# Altium footprint library LukaLIBRARY.PcbLib: 772 footprints (part 26 of 49)
Each footprint in its own frame and in the unit in brackets; x right, y up, seen from the top. Pads: shape width x height; smd on the part's side, far side on the other; paste and mask are expansions set on the pad; w line width, h text height; cw(c..) or ccw(c..) is an arc to the next point about the centre after c.
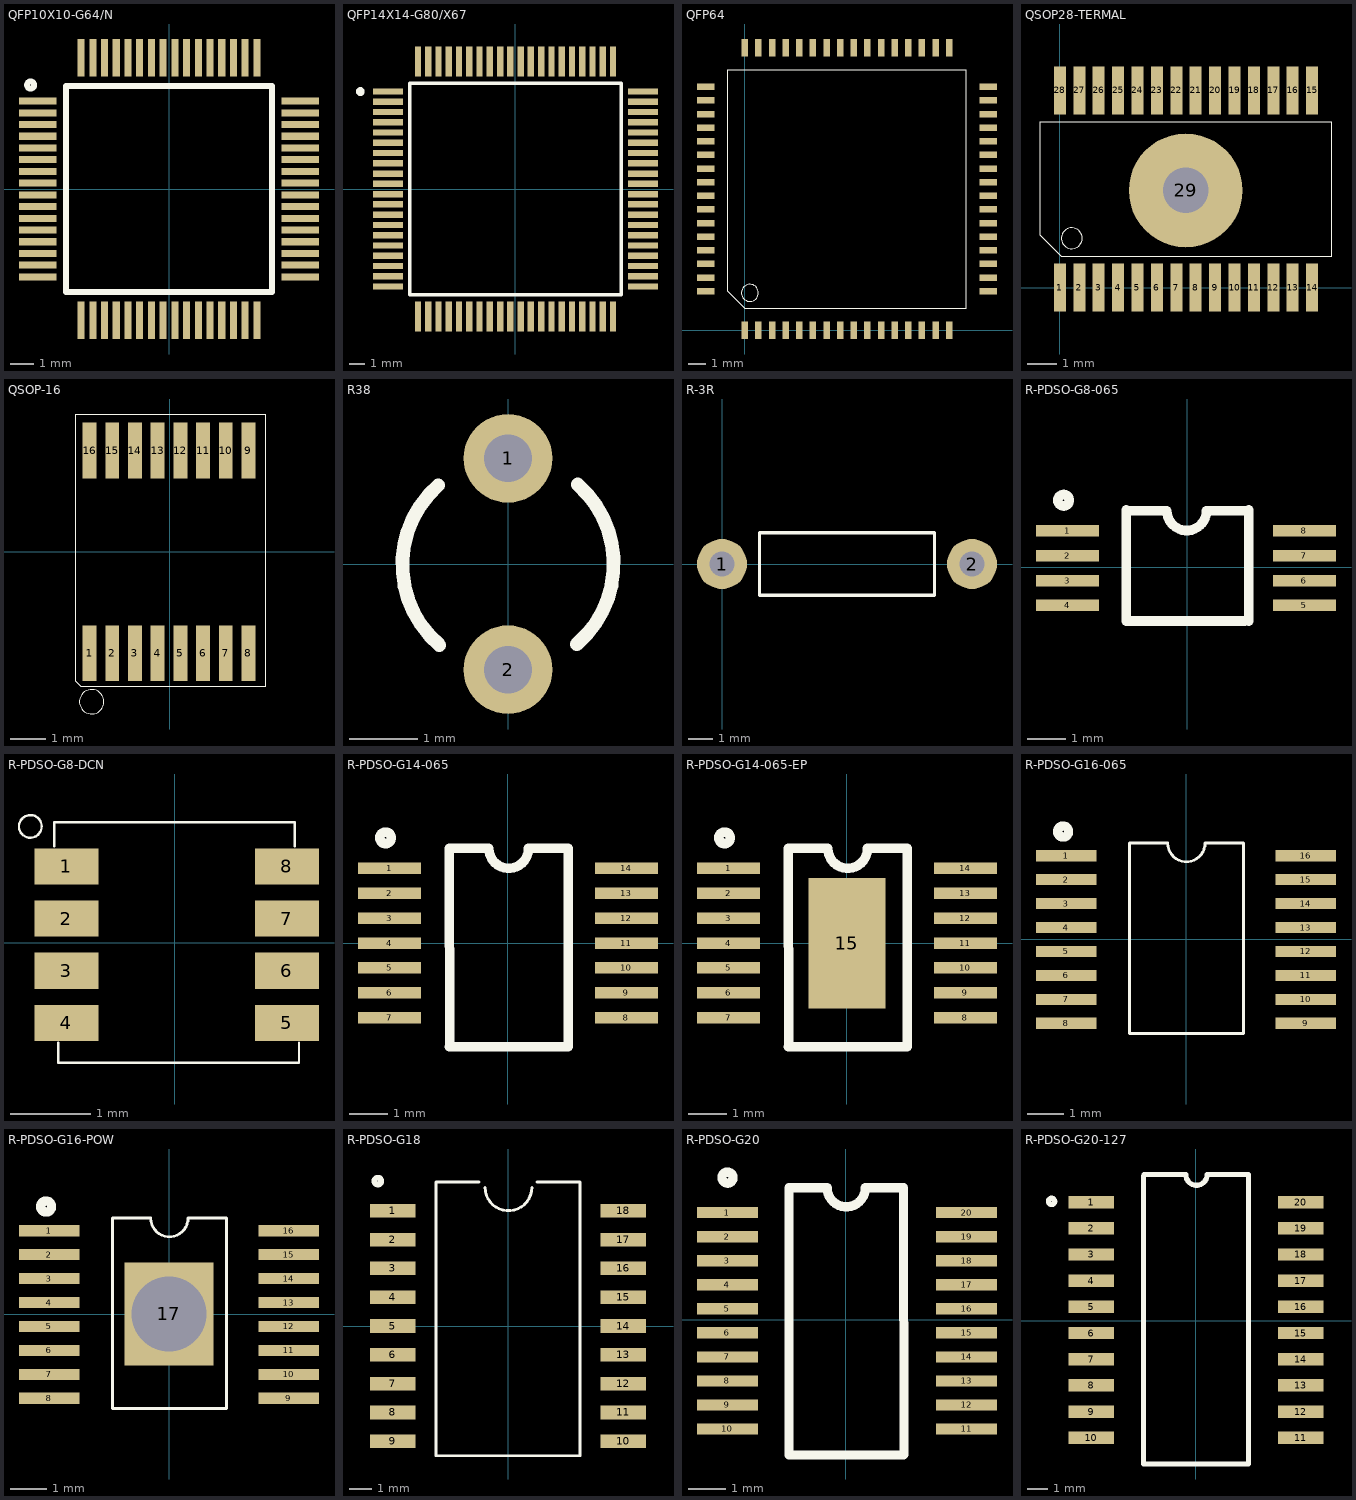
[diagram p25: the footprints below, top view; thin cyan lines are the x and y axes]

## QFP10X10-G64/N [mm]
pads (64):
  rect 1.6x0.3 smd: 1(-5.6,3.75) 2(-5.6,3.25) 3(-5.6,2.75) 4(-5.6,2.25) 5(-5.6,1.75) 6(-5.6,1.25) 7(-5.6,0.75) 8(-5.6,0.25) 9(-5.6,-0.25) 10(-5.6,-0.75) 11(-5.6,-1.25) 12(-5.6,-1.75) 13(-5.6,-2.25) 14(-5.6,-2.75) 15(-5.6,-3.25) 16(-5.6,-3.75) 33(5.6,-3.75) 34(5.6,-3.25) 35(5.6,-2.75) 36(5.6,-2.25) 37(5.6,-1.75) 38(5.6,-1.25) 39(5.6,-0.75) 40(5.6,-0.25) 41(5.6,0.25) 42(5.6,0.75) 43(5.6,1.25) 44(5.6,1.75) 45(5.6,2.25) 46(5.6,2.75) 47(5.6,3.25) 48(5.6,3.75)
  rect 0.3x1.6 smd: 17(-3.75,-5.6) 18(-3.25,-5.6) 19(-2.75,-5.6) 20(-2.25,-5.6) 21(-1.75,-5.6) 22(-1.25,-5.6) 23(-0.75,-5.6) 24(-0.25,-5.6) 25(0.25,-5.6) 26(0.75,-5.6) 27(1.25,-5.6) 28(1.75,-5.6) 29(2.25,-5.6) 30(2.75,-5.6) 31(3.25,-5.6) 32(3.75,-5.6) 49(3.75,5.6) 50(3.25,5.6) 51(2.75,5.6) 52(2.25,5.6) 53(1.75,5.6) 54(1.25,5.6) 55(0.75,5.6) 56(0.25,5.6) 57(-0.25,5.6) 58(-0.75,5.6) 59(-1.25,5.6) 60(-1.75,5.6) 61(-2.25,5.6) 62(-2.75,5.6) 63(-3.25,5.6) 64(-3.75,5.6)
Top Overlay:
  circle w0.25: c-5.905,4.436 r0.15
  lines w0.25: -4.4,-4.4 -4.4,4.4 4.4,4.4 4.4,-4.4 -4.4,-4.4

## QFP14X14-G80/X67 [mm]
pads (80):
  rect 1.9x0.4 smd: 1(-8.077,6.175) 2(-8.077,5.525) 3(-8.077,4.875) 4(-8.077,4.225) 5(-8.077,3.575) 6(-8.077,2.925) 7(-8.077,2.275) 8(-8.077,1.625) 9(-8.077,0.975) 10(-8.077,0.325) 11(-8.077,-0.325) 12(-8.077,-0.975) 13(-8.077,-1.625) 14(-8.077,-2.275) 15(-8.077,-2.925) 16(-8.077,-3.575) 17(-8.077,-4.225) 18(-8.077,-4.875) 19(-8.077,-5.525) 20(-8.077,-6.175) 41(8.077,-6.175) 42(8.077,-5.525) 43(8.077,-4.875) 44(8.077,-4.225) 45(8.077,-3.575) 46(8.077,-2.925) 47(8.077,-2.275) 48(8.077,-1.625) 49(8.077,-0.975) 50(8.077,-0.325) 51(8.077,0.325) 52(8.077,0.975) 53(8.077,1.625) 54(8.077,2.275) 55(8.077,2.925) 56(8.077,3.575) 57(8.077,4.225) 58(8.077,4.875) 59(8.077,5.525) 60(8.077,6.175)
  rect 0.4x1.9 smd: 21(-6.175,-8.077) 22(-5.525,-8.077) 23(-4.875,-8.077) 24(-4.225,-8.077) 25(-3.575,-8.077) 26(-2.925,-8.077) 27(-2.275,-8.077) 28(-1.625,-8.077) 29(-0.975,-8.077) 30(-0.325,-8.077) 31(0.325,-8.077) 32(0.975,-8.077) 33(1.625,-8.077) 34(2.275,-8.077) 35(2.925,-8.077) 36(3.575,-8.077) 37(4.225,-8.077) 38(4.875,-8.077) 39(5.525,-8.077) 40(6.175,-8.077) 61(6.175,8.077) 62(5.525,8.077) 63(4.875,8.077) 64(4.225,8.077) 65(3.575,8.077) 66(2.925,8.077) 67(2.275,8.077) 68(1.625,8.077) 69(0.975,8.077) 70(0.325,8.077) 71(-0.325,8.077) 72(-0.975,8.077) 73(-1.625,8.077) 74(-2.275,8.077) 75(-2.925,8.077) 76(-3.575,8.077) 77(-4.225,8.077) 78(-4.875,8.077) 79(-5.525,8.077) 80(-6.175,8.077)
Top Overlay:
  circle w0.25: c-9.827,6.175 r0.15
  lines w0.25: -6.7,-6.7 -6.7,6.7 6.7,6.7 6.7,-6.7 -6.7,-6.7

## QFP64 [mil]
pads (64):
  rect 15x40 smd mask-1000: 1(0,0) 2(31.5,0) 3(62.99,0) 4(94.49,0) 5(125.98,0) 6(157.48,0) 7(188.98,0) 8(220.47,0) 9(251.97,0) 10(283.46,0) 11(314.96,0) 12(346.46,0) 13(377.95,0) 14(409.45,0) 15(440.94,0) 16(472.44,0) 33(472.44,653.54) 34(440.94,653.54) 35(409.45,653.54) 36(377.95,653.54) 37(346.46,653.54) 38(314.96,653.54) 39(283.46,653.54) 40(251.97,653.54) 41(220.47,653.54) 42(188.98,653.54) 43(157.48,653.54) 44(125.98,653.54) 45(94.49,653.54) 46(62.99,653.54) 47(31.5,653.54) 48(0,653.54)
  rect 40x15 smd mask-1000: 17(562.99,90.55) 18(562.99,122.05) 19(562.99,153.54) 20(562.99,185.04) 21(562.99,216.54) 22(562.99,248.03) 23(562.99,279.53) 24(562.99,311.02) 25(562.99,342.52) 26(562.99,374.02) 27(562.99,405.51) 28(562.99,437.01) 29(562.99,468.5) 30(562.99,500) 31(562.99,531.5) 32(562.99,562.99) 49(-90.55,562.99) 50(-90.55,531.5) 51(-90.55,500) 52(-90.55,468.5) 53(-90.55,437.01) 54(-90.55,405.51) 55(-90.55,374.02) 56(-90.55,342.52) 57(-90.55,311.02) 58(-90.55,279.53) 59(-90.55,248.03) 60(-90.55,216.54) 61(-90.55,185.04) 62(-90.55,153.54) 63(-90.55,122.05) 64(-90.55,90.55)
Top Overlay:
  circle w1: c11.81,86.61 r19.68
  lines w1: -39.37,90.55 -39.37,602.36 511.81,602.36 511.81,51.18 0,51.18 -39.37,90.55
Top Solder:
  drawing of 64 lines, arcs and shapes, not listed

## QSOP28-TERMAL [mm]
pads (29):
  rect 0.4x1.6 smd: 1(0,0) 2(0.65,0) 3(1.3,0) 4(1.95,0) 5(2.6,0) 6(3.25,0) 7(3.9,0) 8(4.55,0) 9(5.2,0) 10(5.85,0) 11(6.5,0) 12(7.15,0) 13(7.8,0) 14(8.45,0) 15(8.45,6.6) 16(7.8,6.6) 17(7.15,6.6) 18(6.5,6.6) 19(5.85,6.6) 20(5.2,6.6) 21(4.55,6.6) 22(3.9,6.6) 23(3.25,6.6) 24(2.6,6.6) 25(1.95,6.6) 26(1.3,6.6) 27(0.65,6.6) 28(0,6.6)
  round 3.81 hole 1.524: 29(4.216,3.251)
Top Overlay:
  circle w0.025: c0.4,1.65 r0.35
  lines w0.025: -0.65,1.75 0.05,1.05 9.1,1.05 9.1,5.55 -0.65,5.55 -0.65,1.75

## QSOP-16 [mm]
pads (16):
  rect 0.4x1.6 smd: 1(-2.3,-2.9) 2(-1.65,-2.9) 3(-1,-2.9) 4(-0.35,-2.9) 5(0.3,-2.9) 6(0.95,-2.9) 7(1.6,-2.9) 8(2.25,-2.9) 9(2.25,2.9) 10(1.6,2.9) 11(0.95,2.9) 12(0.3,2.9) 13(-0.35,2.9) 14(-1,2.9) 15(-1.65,2.9) 16(-2.3,2.9)
Top Overlay:
  circle w0.025: c-2.24,-4.29 r0.35
  lines w0.025: -2.7,-3.7 -2.55,-3.85 2.75,-3.85 2.75,3.95 -2.7,3.95 -2.7,-3.7

## R38 [mm] "Crystal, Thru-Hole; 2 Leads; Body 3.1 x 8.2 mm (Dia.xH)"
height 8.2
pads (2):
  round 1.3 hole 0.7: 1(0,1.55) 2(0,-1.55)
Top Overlay:
  lines w0.2: -1.022,1.155 ccw(c0,-0.01) -1.006,-1.189 ; 1.006,-1.179 ccw(c0,0) 1.022,1.165

## R-3R [mil]
pads (2):
  round 80 hole 40: 1(0,0) 2(400,0)
Top Overlay:
  lines w5: 60,-50 340,-50 340,50 60,50 60,-50

## R-PDSO-G8-065 [mm]
pads (8):
  rect 1.65x0.3 smd: 1(-3.129,0.958) 2(-3.129,0.308) 3(-3.129,-0.342) 4(-3.129,-0.992) 5(3.052,-0.992) 6(3.052,-0.342) 7(3.052,0.308) 8(3.052,0.958)
Top Overlay:
  circle w0.25: c-3.235,1.753 r0.15
  lines w0.25: -1.6,1.5 -1.6,-1.4 1.5,-1.4 ; -1.57,1.478 -0.537,1.478 ccw(c-0.02,1.478) 0.497,1.478 1.53,1.478 ; 1.6,-1.4 1.6,1.5

## R-PDSO-G8-DCN [mm]
pads (8):
  rect 0.8x0.45 smd mask-25.4: 1(-1.35,0.95) 2(-1.35,0.3) 3(-1.35,-0.35) 4(-1.35,-1) 5(1.4,-1) 6(1.4,-0.35) 7(1.4,0.3) 8(1.4,0.95)
Top Overlay:
  circle w0.03: c-1.8,1.45 r0.141
  lines w0.03: -1.5,1.2 -1.5,1.5 1.5,1.5 1.5,1.2 ; -1.45,-1.25 -1.45,-1.5 1.55,-1.5 1.55,-1.25
Top Solder:
  region: -1.75,-1.225 -0.95,-1.225 -0.95,-0.775 -1.75,-0.775
  region: -1.75,0.075 -0.95,0.075 -0.95,0.525 -1.75,0.525
  region: -1.75,0.725 -0.95,0.725 -0.95,1.175 -1.75,1.175
  region: 1,-1.225 1.8,-1.225 1.8,-0.775 1,-0.775
  region: 1,0.725 1.8,0.725 1.8,1.175 1,1.175
  region: 1,0.075 1.8,0.075 1.8,0.525 1,0.525
  region: -1.75,-0.575 -0.95,-0.575 -0.95,-0.125 -1.75,-0.125
  region: 1,-0.575 1.8,-0.575 1.8,-0.125 1,-0.125

## R-PDSO-G14-065 [mm]
pads (14):
  rect 1.65x0.3 smd: 1(-3.089,1.958) 2(-3.089,1.308) 3(-3.089,0.658) 4(-3.089,0.008) 5(-3.089,-0.642) 6(-3.089,-1.292) 7(-3.089,-1.942) 8(3.092,-1.942) 9(3.092,-1.292) 10(3.092,-0.642) 11(3.092,0.008) 12(3.092,0.658) 13(3.092,1.308) 14(3.092,1.958)
Top Overlay:
  circle w0.25: c-3.195,2.753 r0.15
  lines w0.25: -1.53,-2.695 1.57,-2.695 ; -1.524,-2.692 -1.53,2.478 -0.497,2.478 ccw(c0.02,2.478) 0.537,2.478 1.57,2.478 1.575,-2.692

## R-PDSO-G14-065-EP [mm]
pads (15):
  rect 1.65x0.3 smd: 1(-3.089,1.958) 2(-3.089,1.308) 3(-3.089,0.658) 4(-3.089,0.008) 5(-3.089,-0.642) 6(-3.089,-1.292) 7(-3.089,-1.942) 8(3.092,-1.942) 9(3.092,-1.292) 10(3.092,-0.642) 11(3.092,0.008) 12(3.092,0.658) 13(3.092,1.308) 14(3.092,1.958)
  rect 2x3.4 smd: 15(0,0)
Top Overlay:
  circle w0.25: c-3.195,2.753 r0.15
  lines w0.25: -1.53,-2.695 1.57,-2.695 ; -1.524,-2.692 -1.53,2.478 -0.497,2.478 ccw(c0.02,2.478) 0.537,2.478 1.57,2.478 1.575,-2.692

## R-PDSO-G16-065 [mm]
pads (16):
  rect 1.65x0.3 smd: 1(-3.256,2.273) 2(-3.256,1.623) 3(-3.256,0.973) 4(-3.256,0.323) 5(-3.256,-0.327) 6(-3.256,-0.977) 7(-3.256,-1.627) 8(-3.256,-2.277) 9(3.244,-2.277) 10(3.244,-1.627) 11(3.244,-0.977) 12(3.244,-0.327) 13(3.244,0.323) 14(3.244,0.973) 15(3.244,1.623) 16(3.244,2.273)
Top Overlay:
  circle w0.25: c-3.347,2.931 r0.15
  lines w0.076: -1.545,-2.556 1.555,-2.556 ; -1.539,-2.554 -1.545,2.617 -0.511,2.617 ; -0.503,2.617 ccw(c0.005,2.617) 0.513,2.617 ; 0.522,2.617 1.555,2.617 1.56,-2.554

## R-PDSO-G16-POW [mm]
pads (17):
  rect 1.65x0.3 smd: 1(-3.256,2.273) 2(-3.256,1.623) 3(-3.256,0.973) 4(-3.256,0.323) 5(-3.256,-0.327) 6(-3.256,-0.977) 7(-3.256,-1.627) 8(-3.256,-2.277) 9(3.244,-2.277) 10(3.244,-1.627) 11(3.244,-0.977) 12(3.244,-0.327) 13(3.244,0.323) 14(3.244,0.973) 15(3.244,1.623) 16(3.244,2.273)
  rect 2.413x2.794 hole 2.032 unplated: 17(-0.007,0.012)
Top Overlay:
  circle w0.25: c-3.347,2.931 r0.15
  lines w0.076: -1.545,-2.556 1.555,-2.556 ; -1.539,-2.554 -1.545,2.617 -0.511,2.617 ; -0.503,2.617 ccw(c0.005,2.617) 0.513,2.617 ; 0.522,2.617 1.555,2.617 1.56,-2.554
Top Solder:
  region: -1.214,-1.385 1.199,-1.385 1.199,1.409 -1.214,1.409

## R-PDSO-G18 [mm]
pads (18):
  rect 2x0.6 smd mask-25.4: 1(-5.08,5.08) 2(-5.08,3.81) 3(-5.08,2.54) 4(-5.08,1.27) 5(-5.08,0) 6(-5.08,-1.27) 7(-5.08,-2.54) 8(-5.08,-3.81) 9(-5.08,-5.08) 10(5.08,-5.08) 11(5.08,-3.81) 12(5.08,-2.54) 13(5.08,-1.27) 14(5.08,0) 15(5.08,1.27) 16(5.08,2.54) 17(5.08,3.81) 18(5.08,5.08)
Top Overlay:
  circle w0.25: c-5.735,6.385 r0.15
  lines w0.127: -1.27,6.35 -3.175,6.35 -3.175,-5.715 3.175,-5.715 3.175,6.35 1.27,6.35 ; -1.01,6.11 ccw(c0.02,6.11) 1.05,6.11
Top Solder:
  region: -6.08,0.97 -4.08,0.97 -4.08,1.57 -6.08,1.57
  region: -6.08,-0.3 -4.08,-0.3 -4.08,0.3 -6.08,0.3
  region: -6.08,-1.57 -4.08,-1.57 -4.08,-0.97 -6.08,-0.97
  region: -6.08,-2.84 -4.08,-2.84 -4.08,-2.24 -6.08,-2.24
  region: -6.08,-4.11 -4.08,-4.11 -4.08,-3.51 -6.08,-3.51
  region: -6.08,3.51 -4.08,3.51 -4.08,4.11 -6.08,4.11
  region: -6.08,4.78 -4.08,4.78 -4.08,5.38 -6.08,5.38
  region: -6.08,2.24 -4.08,2.24 -4.08,2.84 -6.08,2.84
  region: -6.08,-5.38 -4.08,-5.38 -4.08,-4.78 -6.08,-4.78
  region: 4.08,-4.11 6.08,-4.11 6.08,-3.51 4.08,-3.51
  region: 4.08,-2.84 6.08,-2.84 6.08,-2.24 4.08,-2.24
  region: 4.08,-1.57 6.08,-1.57 6.08,-0.97 4.08,-0.97
  region: 4.08,-0.3 6.08,-0.3 6.08,0.3 4.08,0.3
  region: 4.08,0.97 6.08,0.97 6.08,1.57 4.08,1.57
  region: 4.08,3.51 6.08,3.51 6.08,4.11 4.08,4.11
  region: 4.08,4.78 6.08,4.78 6.08,5.38 4.08,5.38
  region: 4.08,-5.38 6.08,-5.38 6.08,-4.78 4.08,-4.78
  region: 4.08,2.24 6.08,2.24 6.08,2.84 4.08,2.84

## R-PDSO-G20 [mm]
pads (20):
  rect 1.65x0.3 smd: 1(-3.195,2.895) 2(-3.195,2.245) 3(-3.195,1.595) 4(-3.195,0.945) 5(-3.195,0.295) 6(-3.195,-0.355) 7(-3.195,-1.005) 8(-3.195,-1.655) 9(-3.195,-2.305) 10(-3.195,-2.955) 11(3.275,-2.955) 12(3.275,-2.305) 13(3.275,-1.655) 14(3.275,-1.005) 15(3.275,-0.355) 16(3.275,0.295) 17(3.275,0.945) 18(3.275,1.595) 19(3.275,2.245) 20(3.275,2.895)
Top Overlay:
  circle w0.25: c-3.195,3.845 r0.15
  lines w0.25: -1.53,-3.66 1.57,-3.66 ; -1.53,-3.65 -1.53,3.57 -0.497,3.57 ccw(c0.02,3.57) 0.537,3.57 1.57,3.57 1.58,-3.65

## R-PDSO-G20-127 [mm]
pads (20):
  rect 2.2x0.6 smd: 1(-5.07,5.76) 2(-5.07,4.49) 3(-5.07,3.22) 4(-5.07,1.95) 5(-5.07,0.68) 6(-5.07,-0.59) 7(-5.07,-1.86) 8(-5.07,-3.13) 9(-5.07,-4.4) 10(-5.07,-5.67) 11(5.09,-5.67) 12(5.09,-4.4) 13(5.09,-3.13) 14(5.09,-1.86) 15(5.09,-0.59) 16(5.09,0.68) 17(5.09,1.95) 18(5.09,3.22) 19(5.09,4.49) 20(5.09,5.76)
Top Overlay:
  circle w0.25: c-6.995,5.795 r0.15
  lines w0.25: -2.53,7.03 -2.53,-6.94 2.55,-6.94 2.55,7.03 ; -2.52,7.09 -0.5,7.1 ; -0.487,7.09 ccw(c0.03,7.09) 0.547,7.09 2.55,7.1